# Altium schematic symbol library 6-Connectors 连接器.端子.SchLib: 402 symbols (part 3 of 5) (continued)
## Connector D-sub 37 Male (continued)
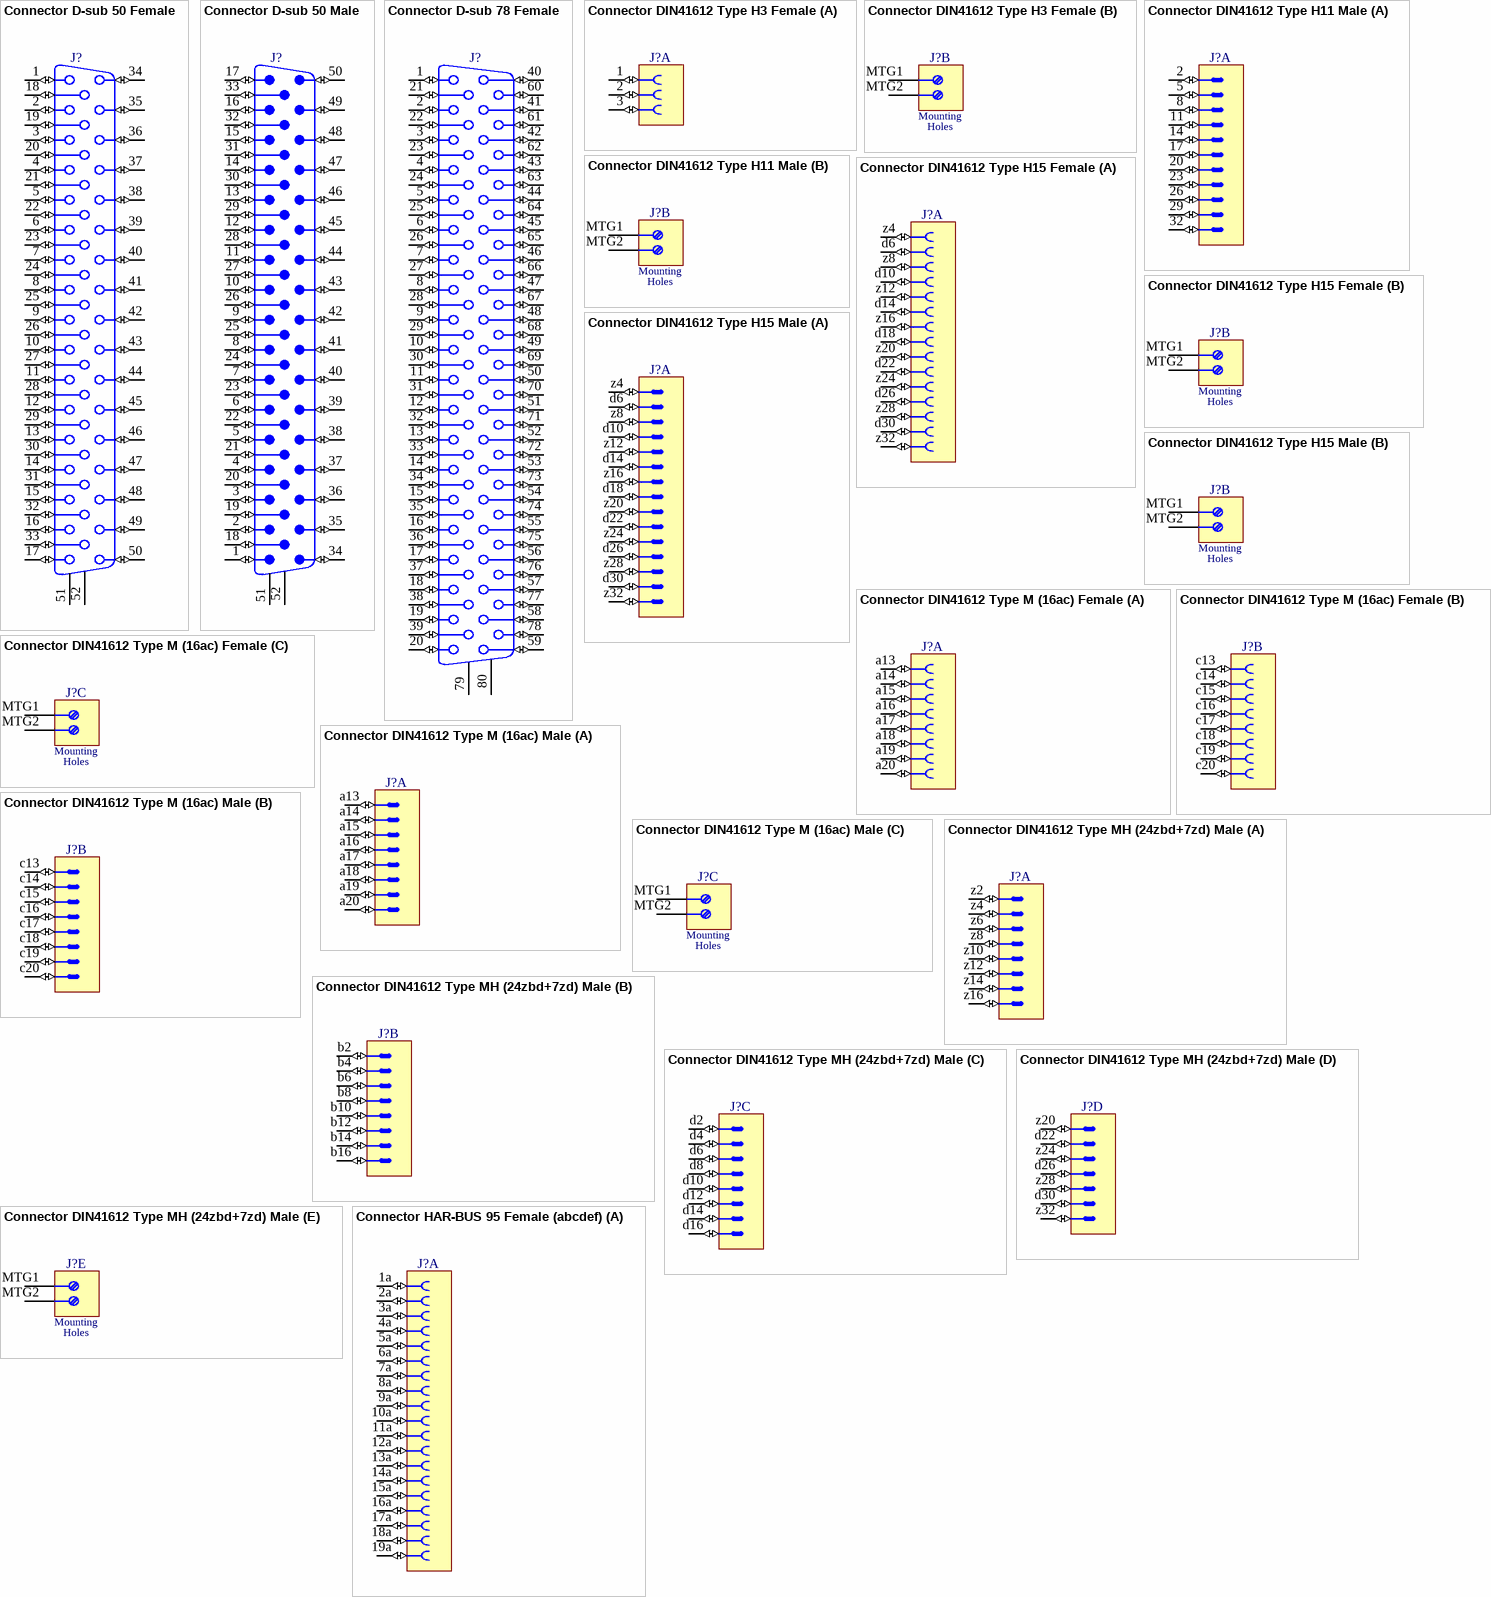
[diagram p27: symbols Connector D-sub 50 Female to Connector HAR-BUS 95 Female (abcdef)]

## Connector D-sub 50 Female
designator J?
Connector D-sub 50 Female
pins: 1 (io), 2 (io), 3 (io), 4 (io), 5 (io), 6 (io), 7 (io), 8 (io), 9 (io), 10 (io), 11 (io), 12 (io), 13 (io), 14 (io), 15 (io), 16 (io), 17 (io), 18 (io), 19 (io), 20 (io), 21 (io), 22 (io), 23 (io), 24 (io), 25 (io), 26 (io), 27 (io), 28 (io), 29 (io), 30 (io), 31 (io), 32 (io), 33 (io), 34 (io), 35 (io), 36 (io), 37 (io), 38 (io), 39 (io), 40 (io), 41 (io), 42 (io), 43 (io), 44 (io), 45 (io), 46 (io), 47 (io), 48 (io), 49 (io), 50 (io), 51, 52
1 alternate drawing of the same symbol

## Connector D-sub 50 Male
designator J?
Connector D-sub 50 Male
pins: 1 (io), 2 (io), 3 (io), 4 (io), 5 (io), 6 (io), 7 (io), 8 (io), 9 (io), 10 (io), 11 (io), 12 (io), 13 (io), 14 (io), 15 (io), 16 (io), 17 (io), 18 (io), 19 (io), 20 (io), 21 (io), 22 (io), 23 (io), 24 (io), 25 (io), 26 (io), 27 (io), 28 (io), 29 (io), 30 (io), 31 (io), 32 (io), 33 (io), 34 (io), 35 (io), 36 (io), 37 (io), 38 (io), 39 (io), 40 (io), 41 (io), 42 (io), 43 (io), 44 (io), 45 (io), 46 (io), 47 (io), 48 (io), 49 (io), 50 (io), 51, 52
1 alternate drawing of the same symbol

## Connector D-sub 78 Female
designator J?
Connector D-sub 78 Female
pins: 1 (io), 2 (io), 3 (io), 4 (io), 5 (io), 6 (io), 7 (io), 8 (io), 9 (io), 10 (io), 11 (io), 12 (io), 13 (io), 14 (io), 15 (io), 16 (io), 17 (io), 18 (io), 19 (io), 20 (io), 21 (io), 22 (io), 23 (io), 24 (io), 25 (io), 26 (io), 27 (io), 28 (io), 29 (io), 30 (io), 31 (io), 32 (io), 33 (io), 34 (io), 35 (io), 36 (io), 37 (io), 38 (io), 39 (io), 40 (io), 41 (io), 42 (io), 43 (io), 44 (io), 45 (io), 46 (io), 47 (io), 48 (io), 49 (io), 50 (io), 51 (io), 52 (io), 53 (io), 54 (io), 55 (io), 56 (io), 57 (io), 58 (io), 59 (io), 60 (io), 61 (io), 62 (io), 63 (io), 64 (io), 65 (io), 66 (io), 67 (io), 68 (io), 69 (io), 70 (io), 71 (io), 72 (io), 73 (io), 74 (io), 75 (io), 76 (io), 77 (io), 78 (io), 79, 80
1 alternate drawing of the same symbol

## Connector DIN41612 Type H3 Female
designator J?
Connector DIN41612 Type H3 Female
part A pins: 1 (io), 2 (io), 3 (io)
part B pins: MTG1 "Mounting Fixture", MTG2 "Mounting Fixture"
part B text: Mounting; Holes

## Connector DIN41612 Type H11 Male
designator J?
Connector DIN41612 Type H11 Male
part A pins: 2 (io), 5 (io), 8 (io), 11 (io), 14 (io), 17 (io), 20 (io), 23 (io), 26 (io), 29 (io), 32 (io)
part B pins: MTG1 "Mounting Fixture", MTG2 "Mounting Fixture"
part B text: Mounting; Holes

## Connector DIN41612 Type H15 Female
designator J?
Connector DIN41612 Type H15 Female
part A pins: d6 (io), d10 (io), d14 (io), d18 (io), d22 (io), d26 (io), d30 (io), z4 (io), z8 (io), z12 (io), z16 (io), z20 (io), z24 (io), z28 (io), z32 (io)
part B pins: MTG1 "Mounting Fixture", MTG2 "Mounting Fixture"
part B text: Mounting; Holes

## Connector DIN41612 Type H15 Male
designator J?
Connector DIN41612 Type H15 Male
part A pins: d6 (io), d10 (io), d14 (io), d18 (io), d22 (io), d26 (io), d30 (io), z4 (io), z8 (io), z12 (io), z16 (io), z20 (io), z24 (io), z28 (io), z32 (io)
part B pins: MTG1 "Mounting Fixture", MTG2 "Mounting Fixture"
part B text: Mounting; Holes

## Connector DIN41612 Type M (16ac) Female
designator J?
DIN 41612, Type M, 16 Contact (Row ac) + 8 Special Contacts, Female Connector
part A pins: a13 (io), a14 (io), a15 (io), a16 (io), a17 (io), a18 (io), a19 (io), a20 (io)
part B pins: c13 (io), c14 (io), c15 (io), c16 (io), c17 (io), c18 (io), c19 (io), c20 (io)
part C pins: MTG1 "Mounting Fixture", MTG2 "Mounting Fixture"
part C text: Mounting; Holes

## Connector DIN41612 Type M (16ac) Male
designator J?
DIN 41612, Type M, 16 Contact (Row ac) + 8 Special Contacts, Male Connector
part A pins: a13 (io), a14 (io), a15 (io), a16 (io), a17 (io), a18 (io), a19 (io), a20 (io)
part B pins: c13 (io), c14 (io), c15 (io), c16 (io), c17 (io), c18 (io), c19 (io), c20 (io)
part C pins: MTG1 "Mounting Fixture", MTG2 "Mounting Fixture"
part C text: Mounting; Holes

## Connector DIN41612 Type MH (24zbd+7zd) Male
designator J?
Connector DIN41612 Type MH (24zbd+7zd) Male
part A pins: z2 (io), z4 (io), z6 (io), z8 (io), z10 (io), z12 (io), z14 (io), z16 (io)
part B pins: b2 (io), b4 (io), b6 (io), b8 (io), b10 (io), b12 (io), b14 (io), b16 (io)
part C pins: d2 (io), d4 (io), d6 (io), d8 (io), d10 (io), d12 (io), d14 (io), d16 (io)
part D pins: d22 (io), d26 (io), d30 (io), z20 (io), z24 (io), z28 (io), z32 (io)
part E pins: MTG1 "Mounting Fixture", MTG2 "Mounting Fixture"
part E text: Mounting; Holes

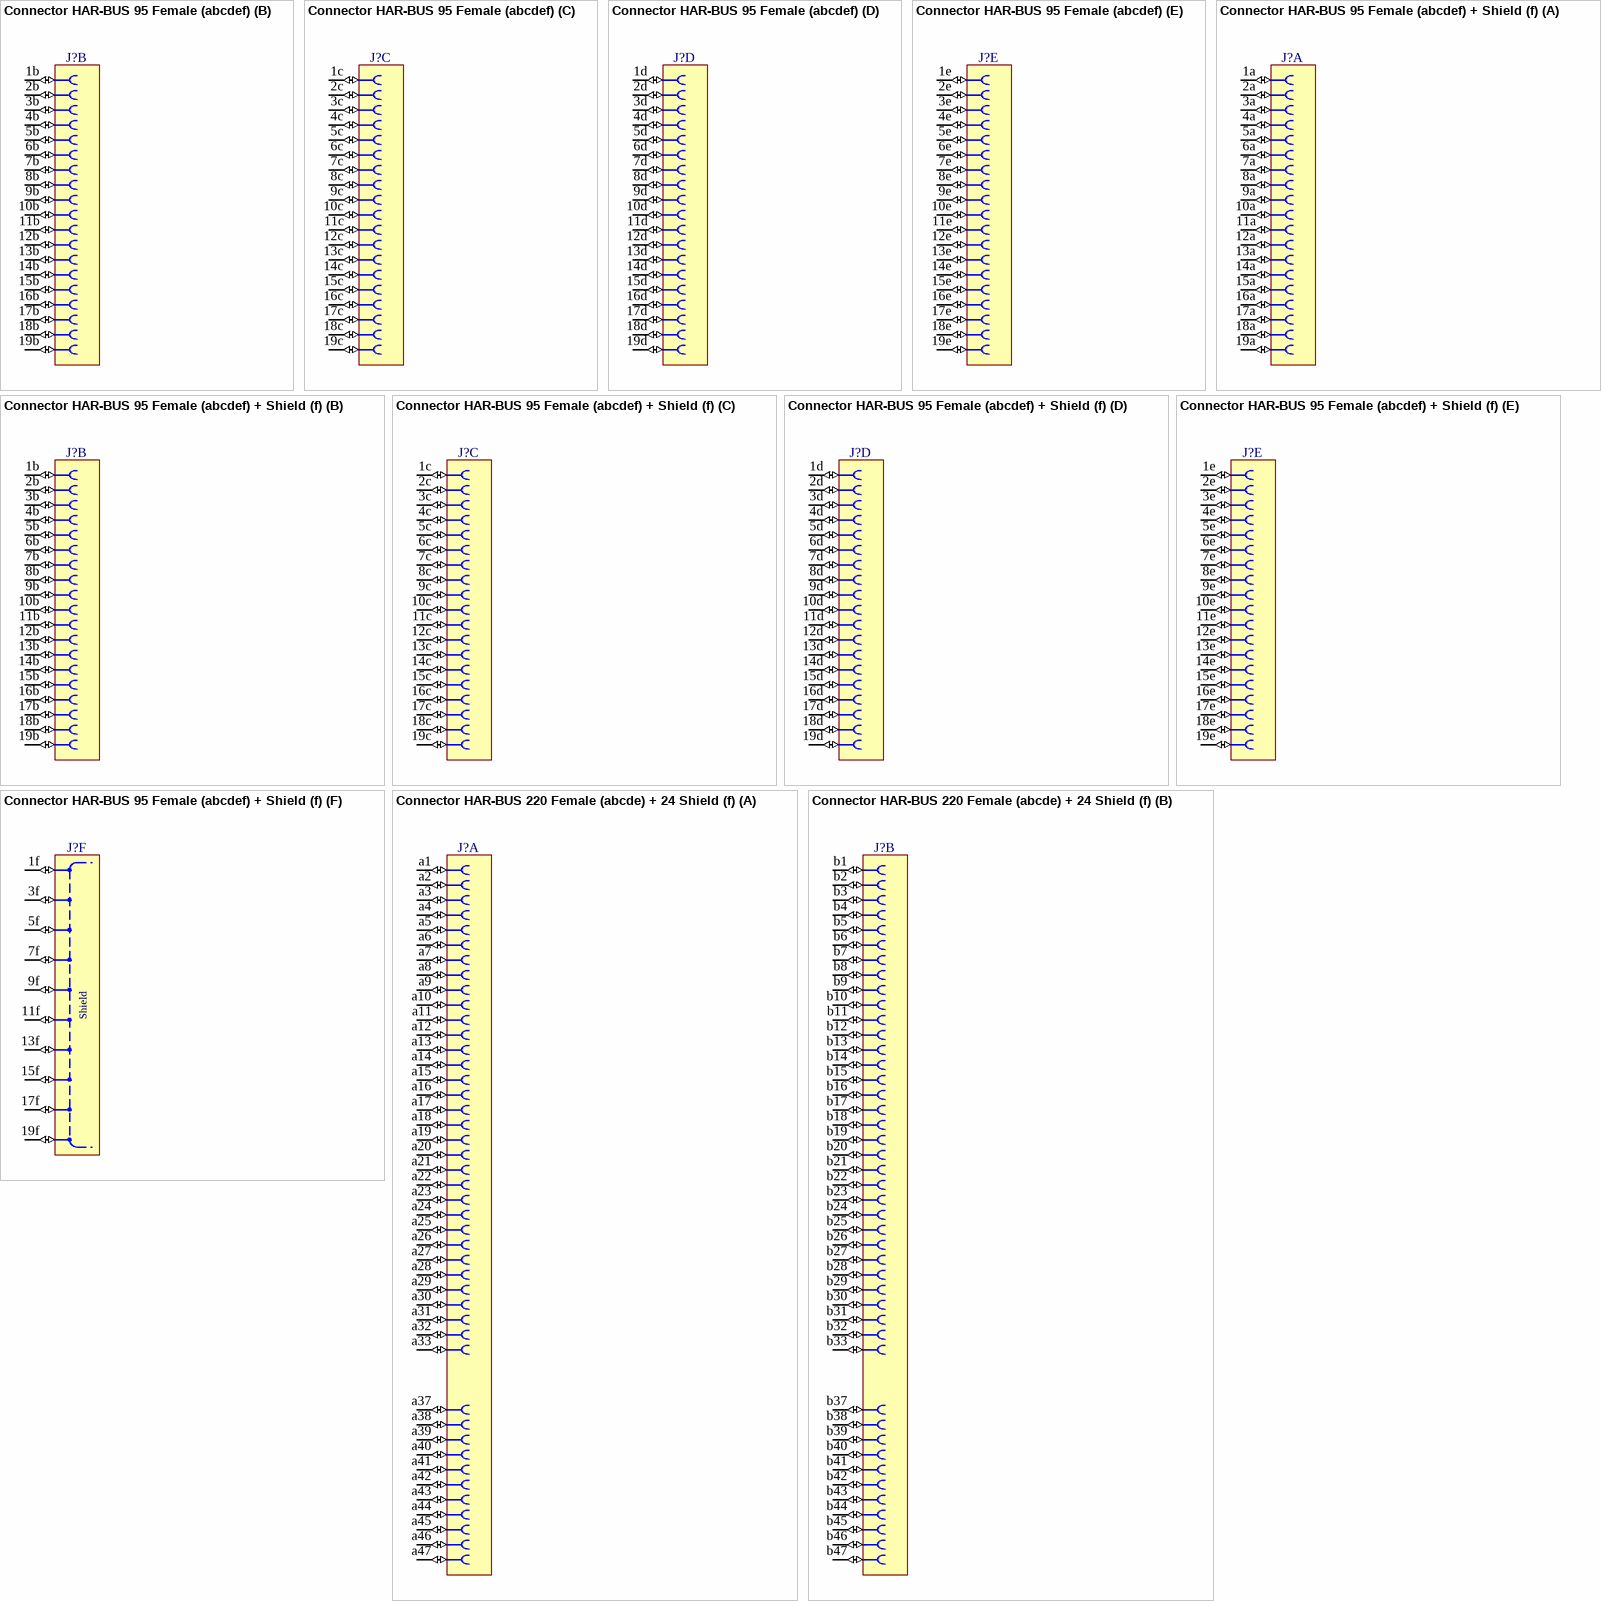
[diagram p28: symbols Connector HAR-BUS 95 Female (abcdef) to Connector HAR-BUS 220 Female (abcde) + 24 Shield (f)]

## Connector HAR-BUS 95 Female (abcdef)
designator J?
Connector HAR-BUS 95 Female (abcdef)
part A pins: 1a 1 (io), 2a 2 (io), 3a 3 (io), 4a 4 (io), 5a 5 (io), 6a 6 (io), 7a 7 (io), 8a 8 (io), 9a 9 (io), 10a 10 (io), 11a 11 (io), 12a 12 (io), 13a 13 (io), 14a 14 (io), 15a 15 (io), 16a 16 (io), 17a 17 (io), 18a 18 (io), 19a 19 (io)
part B pins: 1b 1 (io), 2b 2 (io), 3b 3 (io), 4b 4 (io), 5b 5 (io), 6b 6 (io), 7b 7 (io), 8b 8 (io), 9b 9 (io), 10b 10 (io), 11b 11 (io), 12b 12 (io), 13b 13 (io), 14b 14 (io), 15b 15 (io), 16b 16 (io), 17b 17 (io), 18b 18 (io), 19b 19 (io)
part C pins: 1c 1 (io), 2c 2 (io), 3c 3 (io), 4c 4 (io), 5c 5 (io), 6c 6 (io), 7c 7 (io), 8c 8 (io), 9c 9 (io), 10c 10 (io), 11c 11 (io), 12c 12 (io), 13c 13 (io), 14c 14 (io), 15c 15 (io), 16c 16 (io), 17c 17 (io), 18c 18 (io), 19c 19 (io)
part D pins: 1d 1 (io), 2d 2 (io), 3d 3 (io), 4d 4 (io), 5d 5 (io), 6d 6 (io), 7d 7 (io), 8d 8 (io), 9d 9 (io), 10d 10 (io), 11d 11 (io), 12d 12 (io), 13d 13 (io), 14d 14 (io), 15d 15 (io), 16d 16 (io), 17d 17 (io), 18d 18 (io), 19d 19 (io)
part E pins: 1e 1 (io), 2e 2 (io), 3e 3 (io), 4e 4 (io), 5e 5 (io), 6e 6 (io), 7e 7 (io), 8e 8 (io), 9e 9 (io), 10e 10 (io), 11e 11 (io), 12e 12 (io), 13e 13 (io), 14e 14 (io), 15e 15 (io), 16e 16 (io), 17e 17 (io), 18e 18 (io), 19e 19 (io)

## Connector HAR-BUS 95 Female (abcdef) + Shield (f)
designator J?
Connector HAR-BUS 95 Female (abcdef) + Shield (f)
part A pins: 1a 1 (io), 2a 2 (io), 3a 3 (io), 4a 4 (io), 5a 5 (io), 6a 6 (io), 7a 7 (io), 8a 8 (io), 9a 9 (io), 10a 10 (io), 11a 11 (io), 12a 12 (io), 13a 13 (io), 14a 14 (io), 15a 15 (io), 16a 16 (io), 17a 17 (io), 18a 18 (io), 19a 19 (io)
part B pins: 1b 1 (io), 2b 2 (io), 3b 3 (io), 4b 4 (io), 5b 5 (io), 6b 6 (io), 7b 7 (io), 8b 8 (io), 9b 9 (io), 10b 10 (io), 11b 11 (io), 12b 12 (io), 13b 13 (io), 14b 14 (io), 15b 15 (io), 16b 16 (io), 17b 17 (io), 18b 18 (io), 19b 19 (io)
part C pins: 1c 1 (io), 2c 2 (io), 3c 3 (io), 4c 4 (io), 5c 5 (io), 6c 6 (io), 7c 7 (io), 8c 8 (io), 9c 9 (io), 10c 10 (io), 11c 11 (io), 12c 12 (io), 13c 13 (io), 14c 14 (io), 15c 15 (io), 16c 16 (io), 17c 17 (io), 18c 18 (io), 19c 19 (io)
part D pins: 1d 1 (io), 2d 2 (io), 3d 3 (io), 4d 4 (io), 5d 5 (io), 6d 6 (io), 7d 7 (io), 8d 8 (io), 9d 9 (io), 10d 10 (io), 11d 11 (io), 12d 12 (io), 13d 13 (io), 14d 14 (io), 15d 15 (io), 16d 16 (io), 17d 17 (io), 18d 18 (io), 19d 19 (io)
part E pins: 1e 1 (io), 2e 2 (io), 3e 3 (io), 4e 4 (io), 5e 5 (io), 6e 6 (io), 7e 7 (io), 8e 8 (io), 9e 9 (io), 10e 10 (io), 11e 11 (io), 12e 12 (io), 13e 13 (io), 14e 14 (io), 15e 15 (io), 16e 16 (io), 17e 17 (io), 18e 18 (io), 19e 19 (io)
part F pins: 1f 1 (io), 3f 3 (io), 5f 5 (io), 7f 7 (io), 9f 9 (io), 11f 11 (io), 13f 13 (io), 15f 15 (io), 17f 17 (io), 19f 19 (io)
part F text: Shield

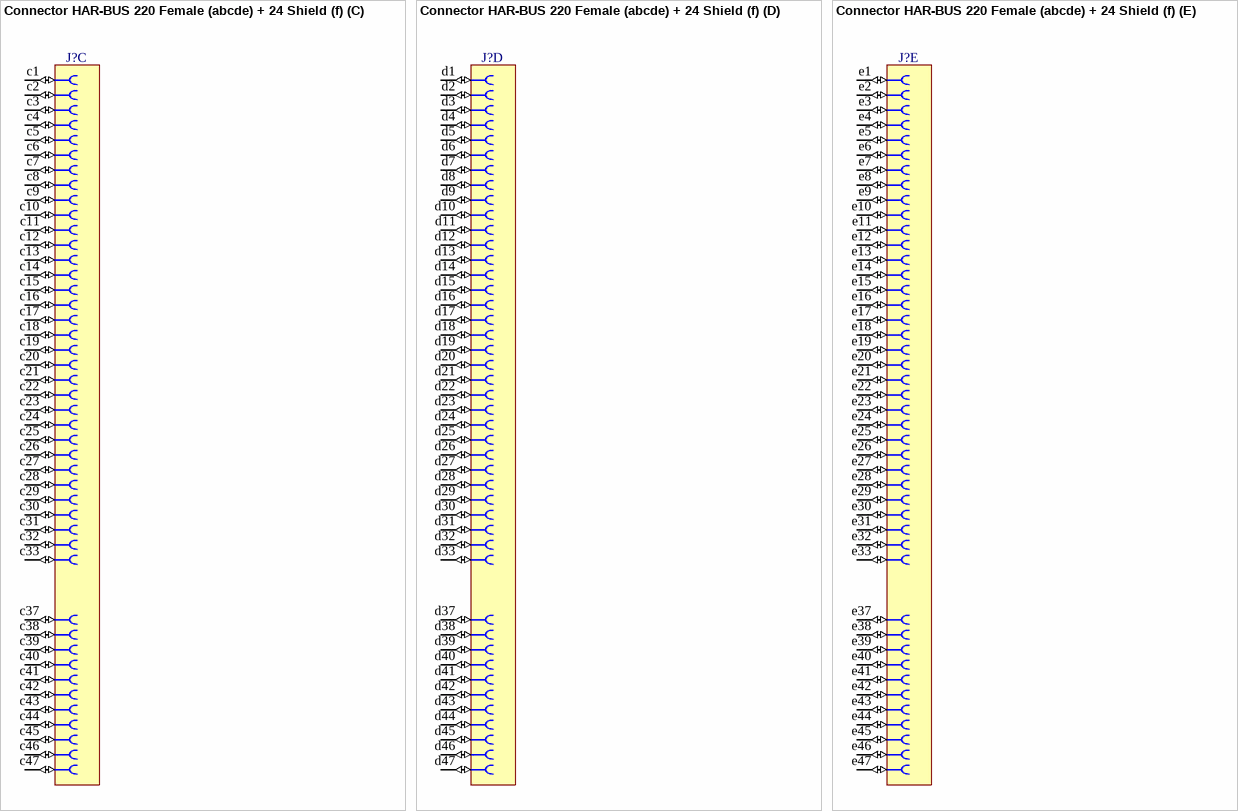
[diagram p29: symbol Connector HAR-BUS 220 Female (abcde) + 24 Shield (f)]

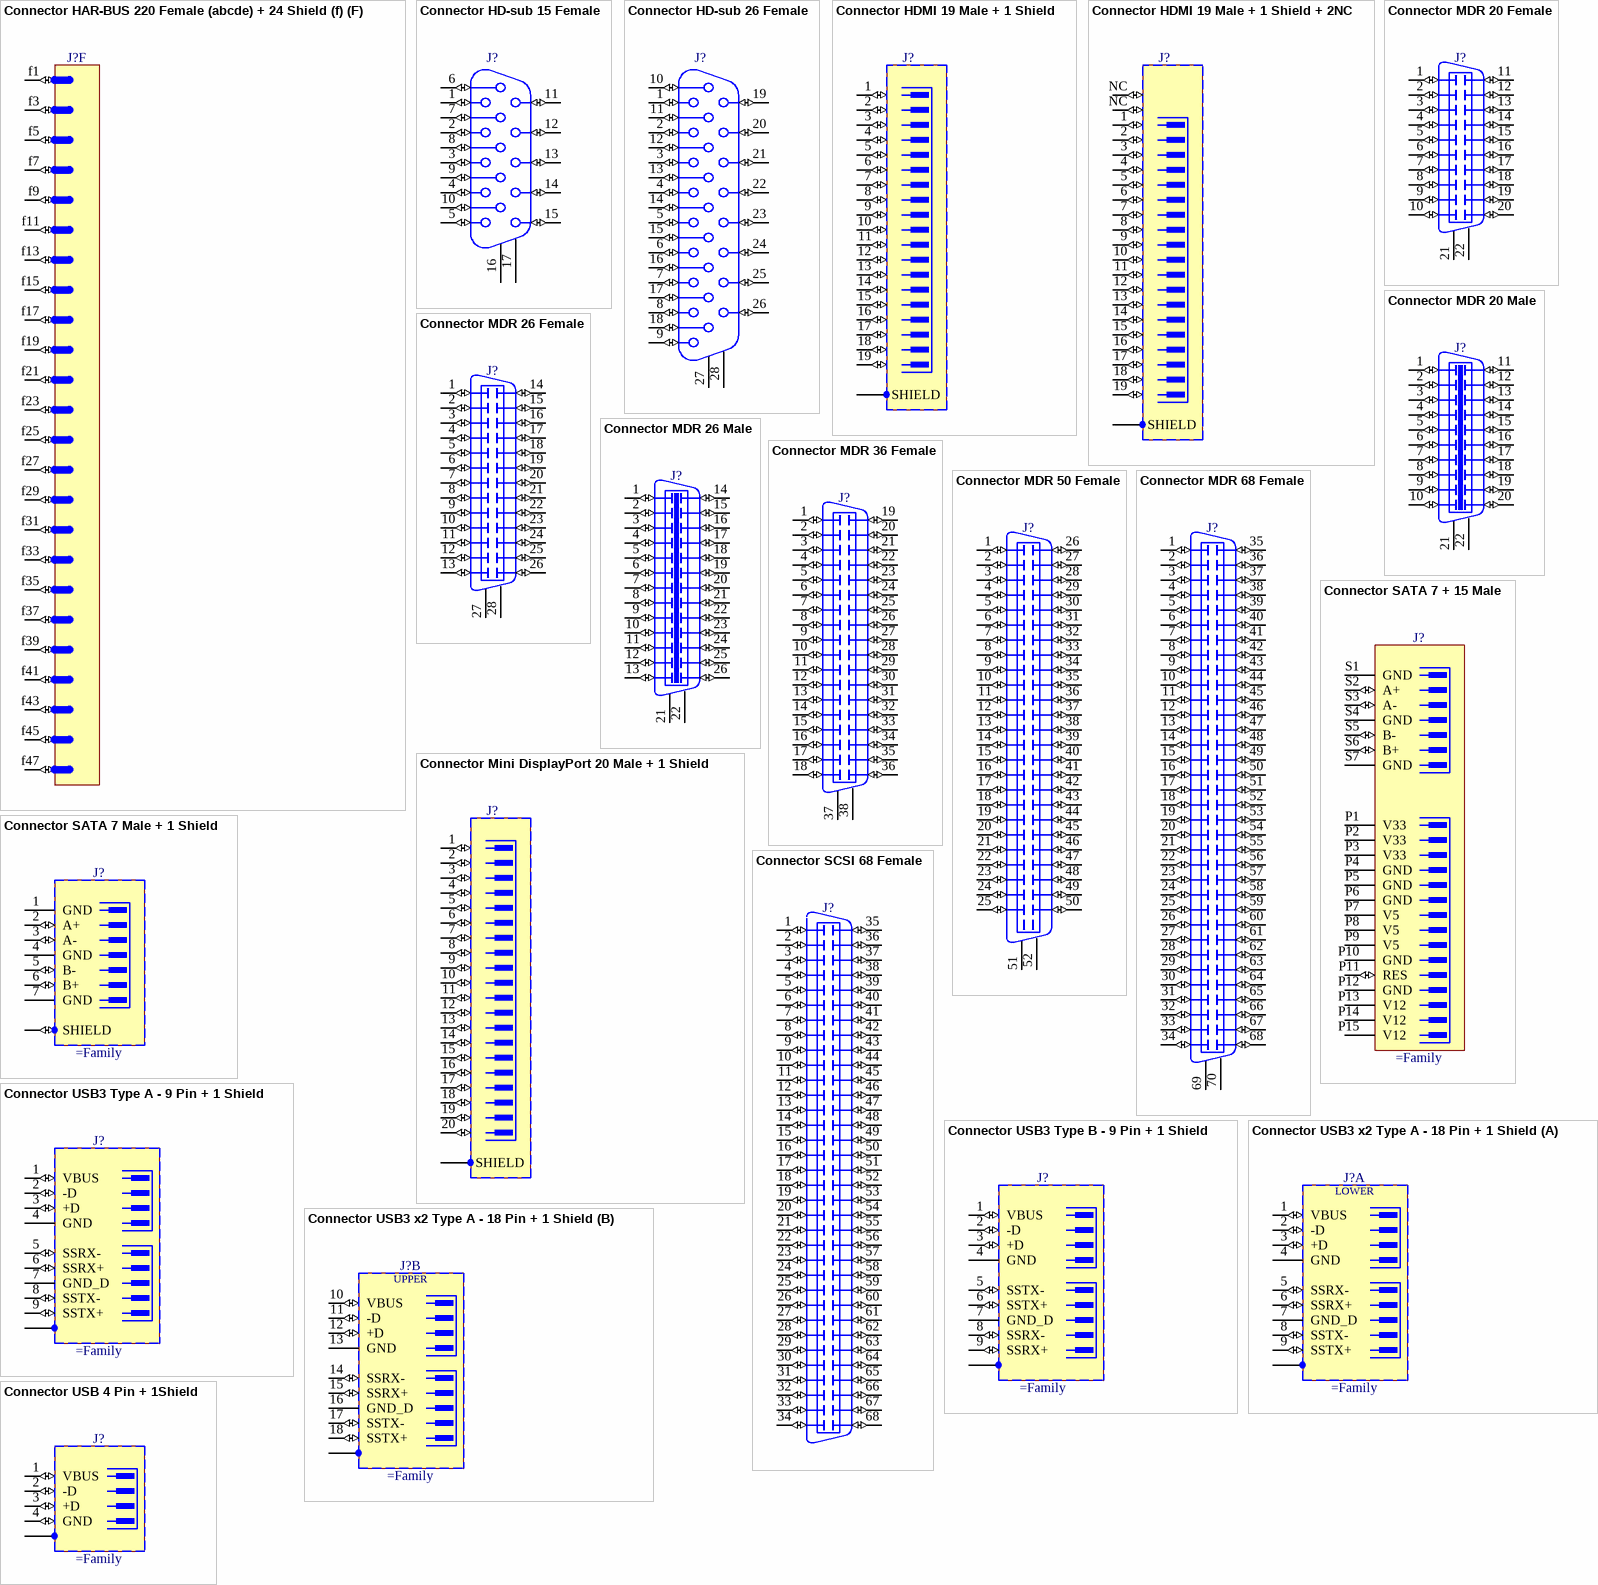
[diagram p30: symbols Connector HAR-BUS 220 Female (abcde) + 24 Shield (f) to Connector USB 4 Pin + 1Shield]

## Connector HAR-BUS 220 Female (abcde) + 24 Shield (f)
designator J?
Connector HAR-BUS 220 Female contacts in 5 row abcde + 24 odd Shield contacts in 1 row f
part A pins: a1 (io), a2 (io), a3 (io), a4 (io), a5 (io), a6 (io), a7 (io), a8 (io), a9 (io), a10 (io), a11 (io), a12 (io), a13 (io), a14 (io), a15 (io), a16 (io), a17 (io), a18 (io), a19 (io), a20 (io), a21 (io), a22 (io), a23 (io), a24 (io), a25 (io), a26 (io), a27 (io), a28 (io), a29 (io), a30 (io), a31 (io), a32 (io), a33 (io), a37 (io), a38 (io), a39 (io), a40 (io), a41 (io), a42 (io), a43 (io), a44 (io), a45 (io), a46 (io), a47 (io)
part B pins: b1 (io), b2 (io), b3 (io), b4 (io), b5 (io), b6 (io), b7 (io), b8 (io), b9 (io), b10 (io), b11 (io), b12 (io), b13 (io), b14 (io), b15 (io), b16 (io), b17 (io), b18 (io), b19 (io), b20 (io), b21 (io), b22 (io), b23 (io), b24 (io), b25 (io), b26 (io), b27 (io), b28 (io), b29 (io), b30 (io), b31 (io), b32 (io), b33 (io), b37 (io), b38 (io), b39 (io), b40 (io), b41 (io), b42 (io), b43 (io), b44 (io), b45 (io), b46 (io), b47 (io)
part C pins: c1 (io), c2 (io), c3 (io), c4 (io), c5 (io), c6 (io), c7 (io), c8 (io), c9 (io), c10 (io), c11 (io), c12 (io), c13 (io), c14 (io), c15 (io), c16 (io), c17 (io), c18 (io), c19 (io), c20 (io), c21 (io), c22 (io), c23 (io), c24 (io), c25 (io), c26 (io), c27 (io), c28 (io), c29 (io), c30 (io), c31 (io), c32 (io), c33 (io), c37 (io), c38 (io), c39 (io), c40 (io), c41 (io), c42 (io), c43 (io), c44 (io), c45 (io), c46 (io), c47 (io)
part D pins: d1 (io), d2 (io), d3 (io), d4 (io), d5 (io), d6 (io), d7 (io), d8 (io), d9 (io), d10 (io), d11 (io), d12 (io), d13 (io), d14 (io), d15 (io), d16 (io), d17 (io), d18 (io), d19 (io), d20 (io), d21 (io), d22 (io), d23 (io), d24 (io), d25 (io), d26 (io), d27 (io), d28 (io), d29 (io), d30 (io), d31 (io), d32 (io), d33 (io), d37 (io), d38 (io), d39 (io), d40 (io), d41 (io), d42 (io), d43 (io), d44 (io), d45 (io), d46 (io), d47 (io)
part E pins: e1 (io), e2 (io), e3 (io), e4 (io), e5 (io), e6 (io), e7 (io), e8 (io), e9 (io), e10 (io), e11 (io), e12 (io), e13 (io), e14 (io), e15 (io), e16 (io), e17 (io), e18 (io), e19 (io), e20 (io), e21 (io), e22 (io), e23 (io), e24 (io), e25 (io), e26 (io), e27 (io), e28 (io), e29 (io), e30 (io), e31 (io), e32 (io), e33 (io), e37 (io), e38 (io), e39 (io), e40 (io), e41 (io), e42 (io), e43 (io), e44 (io), e45 (io), e46 (io), e47 (io)
part F pins: f1 (io), f3 (io), f5 (io), f7 (io), f9 (io), f11 (io), f13 (io), f15 (io), f17 (io), f19 (io), f21 (io), f23 (io), f25 (io), f27 (io), f29 (io), f31 (io), f33 (io), f35 (io), f37 (io), f39 (io), f41 (io), f43 (io), f45 (io), f47 (io)

## Connector HD-sub 15 Female
designator J?
Connector High Density D-sub 15 Female
pins: 1 (io), 2 (io), 3 (io), 4 (io), 5 (io), 6 (io), 7 (io), 8 (io), 9 (io), 10 (io), 11 (io), 12 (io), 13 (io), 14 (io), 15 (io), 16, 17
1 alternate drawing of the same symbol

## Connector HD-sub 26 Female
designator J?
Connector High Density D-sub 26 Female
pins: 1 (io), 2 (io), 3 (io), 4 (io), 5 (io), 6 (io), 7 (io), 8 (io), 9 (io), 10 (io), 11 (io), 12 (io), 13 (io), 14 (io), 15 (io), 16 (io), 17 (io), 18 (io), 19 (io), 20 (io), 21 (io), 22 (io), 23 (io), 24 (io), 25 (io), 26 (io), 27, 28
1 alternate drawing of the same symbol

## Connector HDMI 19 Male + 1 Shield
designator J?
Connector HDMI 19 Male + 1 Shield
pins: 1 (io), 2 (io), 3 (io), 4 (io), 5 (io), 6 (io), 7 (io), 8 (io), 9 (io), 10 (io), 11 (io), 12 (io), 13 (io), 14 (io), 15 (io), 16 (io), 17 (io), 18 (io), 19 (io), SHIELD (power)

## Connector HDMI 19 Male + 1 Shield + 2NC
designator J?
Connector HDMI 19 Male + 1 Shield + 2 Not Connected Pads
pins: 1 (io), 2 (io), 3 (io), 4 (io), 5 (io), 6 (io), 7 (io), 8 (io), 9 (io), 10 (io), 11 (io), 12 (io), 13 (io), 14 (io), 15 (io), 16 (io), 17 (io), 18 (io), 19 (io), NC (io), NC (io), SHIELD (power)

## Connector MDR 20 Female
designator J?
Connector Mini D Ribbon (MDR) 20 Female
pins: 1 (io), 2 (io), 3 (io), 4 (io), 5 (io), 6 (io), 7 (io), 8 (io), 9 (io), 10 (io), 11 (io), 12 (io), 13 (io), 14 (io), 15 (io), 16 (io), 17 (io), 18 (io), 19 (io), 20 (io), 21, 22

## Connector MDR 20 Male
designator J?
Connector Mini D Ribbon (MDR) 20 Male
pins: 1 (io), 2 (io), 3 (io), 4 (io), 5 (io), 6 (io), 7 (io), 8 (io), 9 (io), 10 (io), 11 (io), 12 (io), 13 (io), 14 (io), 15 (io), 16 (io), 17 (io), 18 (io), 19 (io), 20 (io), 21, 22

## Connector MDR 26 Female
designator J?
Connector Mini D Ribbon (MDR) 26 Female
pins: 1 (io), 2 (io), 3 (io), 4 (io), 5 (io), 6 (io), 7 (io), 8 (io), 9 (io), 10 (io), 11 (io), 12 (io), 13 (io), 14 (io), 15 (io), 16 (io), 17 (io), 18 (io), 19 (io), 20 (io), 21 (io), 22 (io), 23 (io), 24 (io), 25 (io), 26 (io), 27, 28

## Connector MDR 26 Male
designator J?
Connector Mini D Ribbon (MDR) 26 Male
pins: 1 (io), 2 (io), 3 (io), 4 (io), 5 (io), 6 (io), 7 (io), 8 (io), 9 (io), 10 (io), 11 (io), 12 (io), 13 (io), 14 (io), 15 (io), 16 (io), 17 (io), 18 (io), 19 (io), 20 (io), 21 (io), 21, 22 (io), 22, 23 (io), 24 (io), 25 (io), 26 (io)

## Connector MDR 36 Female
designator J?
Connector Mini D Ribbon (MDR) 36 Female
pins: 1 (io), 2 (io), 3 (io), 4 (io), 5 (io), 6 (io), 7 (io), 8 (io), 9 (io), 10 (io), 11 (io), 12 (io), 13 (io), 14 (io), 15 (io), 16 (io), 17 (io), 18 (io), 19 (io), 20 (io), 21 (io), 22 (io), 23 (io), 24 (io), 25 (io), 26 (io), 27 (io), 28 (io), 29 (io), 30 (io), 31 (io), 32 (io), 33 (io), 34 (io), 35 (io), 36 (io), 37, 38

## Connector MDR 50 Female
designator J?
Connector Mini D Ribbon (MDR) 50 Female
pins: 1 (io), 2 (io), 3 (io), 4 (io), 5 (io), 6 (io), 7 (io), 8 (io), 9 (io), 10 (io), 11 (io), 12 (io), 13 (io), 14 (io), 15 (io), 16 (io), 17 (io), 18 (io), 19 (io), 20 (io), 21 (io), 22 (io), 23 (io), 24 (io), 25 (io), 26 (io), 27 (io), 28 (io), 29 (io), 30 (io), 31 (io), 32 (io), 33 (io), 34 (io), 35 (io), 36 (io), 37 (io), 38 (io), 39 (io), 40 (io), 41 (io), 42 (io), 43 (io), 44 (io), 45 (io), 46 (io), 47 (io), 48 (io), 49 (io), 50 (io), 51, 52

## Connector MDR 68 Female
designator J?
Connector Mini D Ribbon (MDR) 68 Female
pins: 1 (io), 2 (io), 3 (io), 4 (io), 5 (io), 6 (io), 7 (io), 8 (io), 9 (io), 10 (io), 11 (io), 12 (io), 13 (io), 14 (io), 15 (io), 16 (io), 17 (io), 18 (io), 19 (io), 20 (io), 21 (io), 22 (io), 23 (io), 24 (io), 25 (io), 26 (io), 27 (io), 28 (io), 29 (io), 30 (io), 31 (io), 32 (io), 33 (io), 34 (io), 35 (io), 36 (io), 37 (io), 38 (io), 39 (io), 40 (io), 41 (io), 42 (io), 43 (io), 44 (io), 45 (io), 46 (io), 47 (io), 48 (io), 49 (io), 50 (io), 51 (io), 52 (io), 53 (io), 54 (io), 55 (io), 56 (io), 57 (io), 58 (io), 59 (io), 60 (io), 61 (io), 62 (io), 63 (io), 64 (io), 65 (io), 66 (io), 67 (io), 68 (io), 69, 70

## Connector Mini DisplayPort 20 Male + 1 Shield
designator J?
Connector Mini DisplayPort 20 Male + 1 Shield
pins: 1 (io), 2 (io), 3 (io), 4 (io), 5 (io), 6 (io), 7 (io), 8 (io), 9 (io), 10 (io), 11 (io), 12 (io), 13 (io), 14 (io), 15 (io), 16 (io), 17 (io), 18 (io), 19 (io), 20 (io), SHIELD (power)

## Connector SATA 7 + 15 Male
designator J?
7 Signal Pin + 15 Power Pin SATA Connecteur
pins: P1 V33 (power), P2 V33 (power), P3 V33 (power), P4 GND (power), P5 GND (power), P6 GND (power), P7 V5 (power), P8 V5 (power), P9 V5 (power), P10 GND (power), P11 RES (io), P12 GND (power), P13 V12 (power), P14 V12 (power), P15 V12 (power), S1 GND (power) "Ground", S2 A+ (io) "Transmit+", S3 A- (io) "Transmit-", S4 GND (power) "Ground", S5 B- (io) "Receive-", S6 B+ (io) "Receive+", S7 GND (power) "Ground"

## Connector SATA 7 Male + 1 Shield
designator J?
7 Pin + 1 Shield SATA Receptacle
pins: 1 GND (power) "Ground", 2 A+ (io) "Transmit+", 3 A- (io) "Transmit-", 4 GND (power) "Ground", 5 B- (io) "Receive-", 6 B+ (io) "Receive+", 7 GND (power) "Ground", 8 SHIELD (io)

## Connector SCSI 68 Female
designator J?
Connector SCSI 68 Female
pins: 1 (io), 2 (io), 3 (io), 4 (io), 5 (io), 6 (io), 7 (io), 8 (io), 9 (io), 10 (io), 11 (io), 12 (io), 13 (io), 14 (io), 15 (io), 16 (io), 17 (io), 18 (io), 19 (io), 20 (io), 21 (io), 22 (io), 23 (io), 24 (io), 25 (io), 26 (io), 27 (io), 28 (io), 29 (io), 30 (io), 31 (io), 32 (io), 33 (io), 34 (io), 35 (io), 36 (io), 37 (io), 38 (io), 39 (io), 40 (io), 41 (io), 42 (io), 43 (io), 44 (io), 45 (io), 46 (io), 47 (io), 48 (io), 49 (io), 50 (io), 51 (io), 52 (io), 53 (io), 54 (io), 55 (io), 56 (io), 57 (io), 58 (io), 59 (io), 60 (io), 61 (io), 62 (io), 63 (io), 64 (io), 65 (io), 66 (io), 67 (io), 68 (io)

## Connector USB3 Type A - 9 Pin + 1 Shield
designator J?
9 Pin + 1 Shield USB 3.0 Type A Receptacle
pins: 1 VBUS (io), 2 -D (io), 3 +D (io), 4 GND (power), 5 SSRX- (io), 6 SSRX+ (io), 7 GND_D (power), 8 SSTX- (io), 9 SSTX+ (io), 10 SHIELD (power)

## Connector USB3 Type B - 9 Pin + 1 Shield
designator J?
9 Pin + 1 Shield USB 3.0 Type B Receptacle
pins: 1 VBUS (io), 2 -D (io), 3 +D (io), 4 GND (power), 5 SSTX- (io), 6 SSTX+ (io), 7 GND_D (power), 8 SSRX- (io), 9 SSRX+ (io), 10 SHIELD (power)

## Connector USB3 x2 Type A - 18 Pin + 1 Shield
designator J?
2x9 Pin + 1 Shield  Duals USB 3.0 Type A Receptacle
part A pins: 1 VBUS (io), 2 -D (io), 3 +D (io), 4 GND (power), 5 SSRX- (io), 6 SSRX+ (io), 7 GND_D (power), 8 SSTX- (io), 9 SSTX+ (io), 19 SHIELD (power)
part B pins: 10 VBUS (io), 11 -D (io), 12 +D (io), 13 GND (power), 14 SSRX- (io), 15 SSRX+ (io), 16 GND_D (power), 17 SSTX- (io), 18 SSTX+ (io), 20 SHIELD (power)
part A text: LOWER
part B text: UPPER

## Connector USB 4 Pin + 1Shield
designator J?
4 Pin + 1 Shield USB Receptacle
pins: 1 VBUS (io), 2 -D (io), 3 +D (io), 4 GND (io), 5 SHIELD (power)
